# Altium schematic symbol library Analog Devices Data Converters Analog-to-Digital Converters.SchLib: 2404 symbols (part 116 of 213)
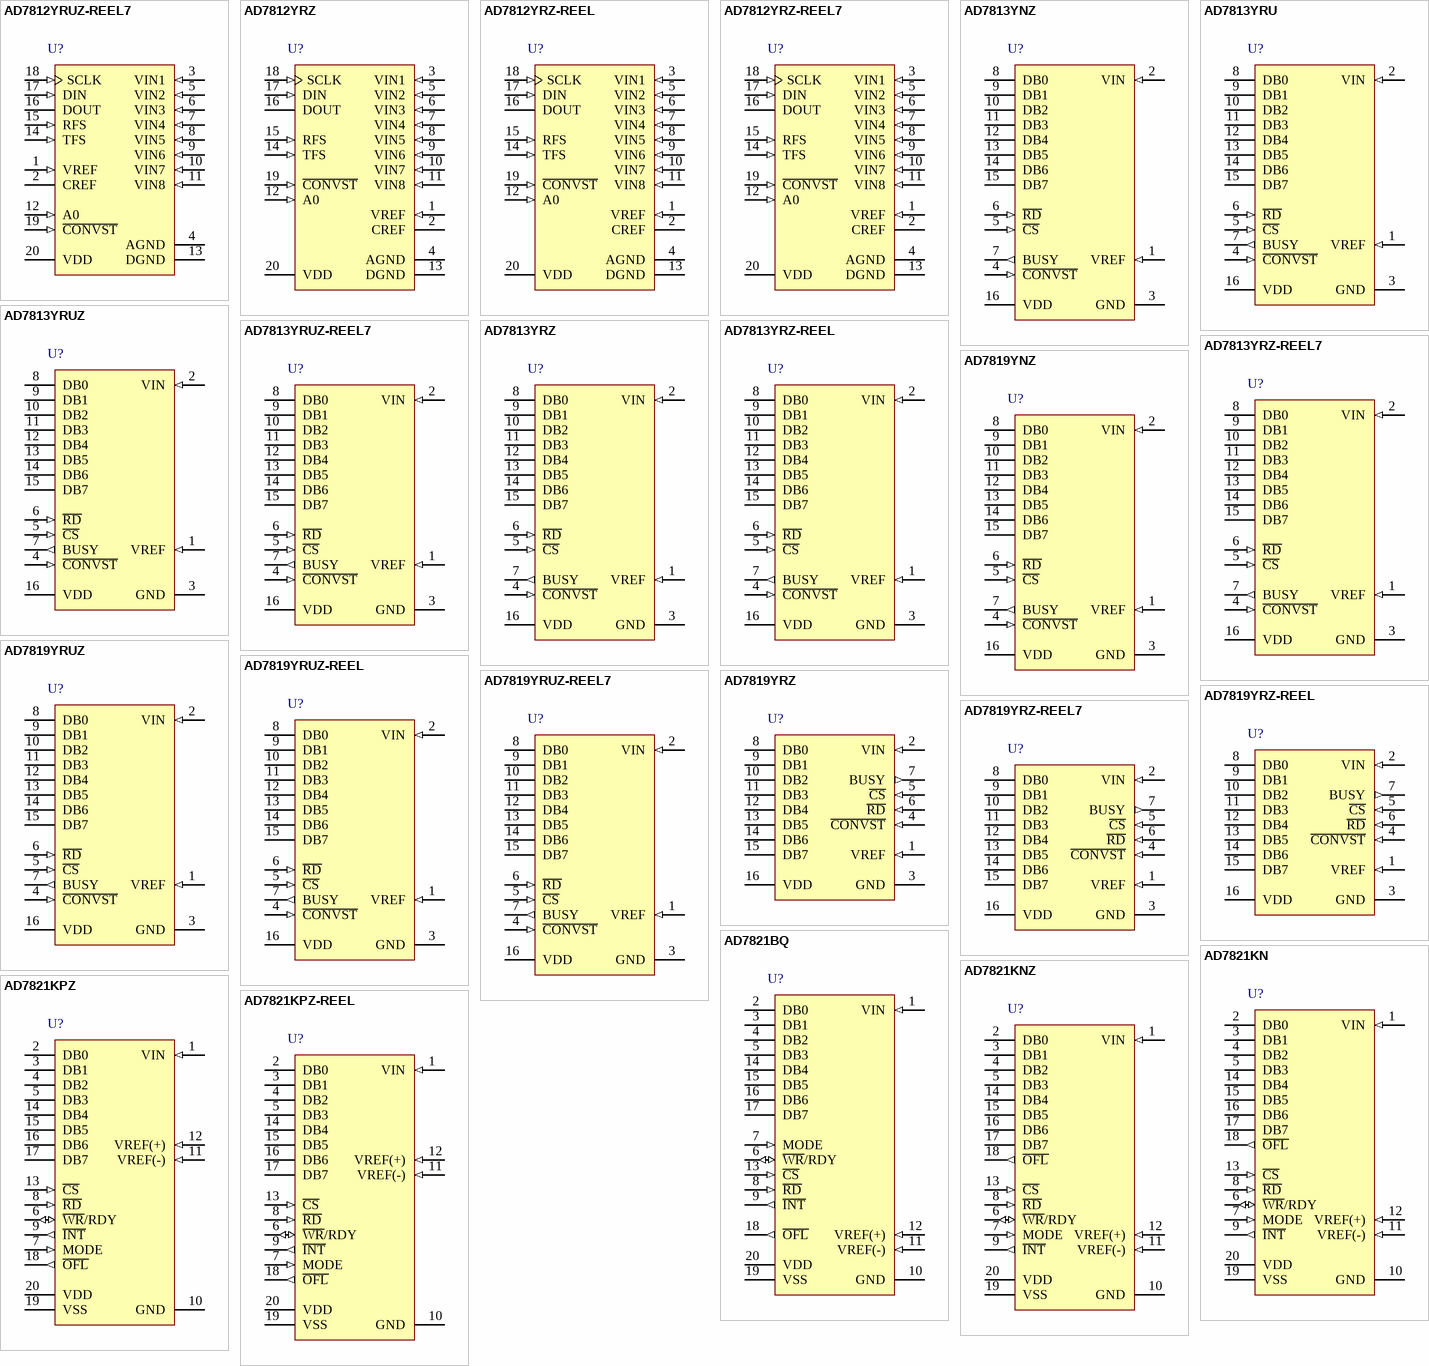
[diagram p271: symbols AD7812YRUZ-REEL7 to AD7821KPZ-REEL]

## AD7821BQ
designator U?
Single 8-Bit uP Compatible Analog-to-Digital Converter with Parallel Interface and Track / Hold, LC2MOS, 1MSPS, -40 to +85 degC, Q-20, Tube; Generic Part Number: AD7821; Manufacturer: Analog Devices; PartNumber: AD7821BQ; Resolution (Bits): 8; Channels: 1; Throughput Rate (SPS): 1M; Interface: Par; DatasheetVersion: Rev.B; PackageVersion: Dec-2004; PackageReference: Q-20; PackageDescription: 20-Lead Ceramic Dual In-Line Package [CERDIP]; Supplier 1: Digi-Key; Supplier Part Number 1: AD7821BQ-ND; Supplier 2: Mouser; Supplier Part Number 2: 584-AD7821BQ; RoHS: N; Packing: Tube; Mounting Technology: Through-hole; ComponentLink1Description: Manufacturer URL; ComponentLink1URL: http://www.analog.com/en/index.html; ComponentLink2Description: Datasheet; ComponentLink2URL: http://www.analog.com/static/imported-files/data_sheets/AD7821.pdf; ComponentLink3Description: Package Specification; ComponentLink3URL: http://www.analog.com/static/imported-files/packages/50516416473314Q_20.pdf; ComponentLink4Description: Product URL; ComponentLink4URL: http://www.analog.com/en/analog-to-digital-converters/ad-converters/ad7821/products/product.html
footprint Q-20 (DIP, 20-Leads, Row Spacing 7.62mm, Pitch 2.54mm, Body 25.9x6.7mm)
pins: 1 VIN (in) "Analog Input: Range VREF(-) =< VIN =< VREF(+)", 2 DB0 (hiz) "Three-State Data Output (LSB)", 3 DB1 (hiz) "Three-State Data Outputs", 4 DB2 (hiz) "Three-State Data Outputs", 5 DB3 (hiz) "Three-State Data Outputs", 6 ~{WR}/RDY (io) "WRITE control input/READY status output. See Digital Interface section.", 7 MODE (in) "Mode Selection Input. It determines whether the device operates in the WR-RD or RD mode. This input is internally pulled low through a 50 uA current source. See Digital Interface section.", 8 ~{RD} (in) "READ Input. R\D\ must be low to access data from the part. See Digital Interface section.", 9 ~{INT} (out) "INTERRUPT Output. I\N\T\ going low indicates that the conversion is complete. I\N\T\ returns high on the rising edge of C\S\ or R\D\. See Digital Interface section.", 10 GND (power) "Ground", 11 VREF(-) (in) "Lower limit of reference span. Range: VSS =< VREF(-) =< VREF(+).", 12 VREF(+) (in) "Upper limit of reference span. Range: VREF(-) < VREF(+) =< VDD.", 13 ~{CS} (in) "Chip Select Input. The device is selected when this input is low.", 14 DB4 (hiz) "Three-State Data Outputs", 15 DB5 (hiz) "Three-State Data Outputs", 16 DB6 (hiz) "Three-State Data Outputs", 17 DB7 (hiz) "Three-State Data Output (MSB)", 18 ~{OFL} (out) "Overflow Output. If the analog input is higher than (VREF(+) - 1/2 LSB), O\F\L\ will be low at the end of conversion. It is a non-three-state output which can be used to cascade two or more devices to increase resolution.", 19 VSS (power) "Negative Supply Voltage VSS = 0 V; Unipolar Operation VSS = -5 V; Bipolar Operation", 20 VDD (power) "Positive Supply Voltage, +5 V"

## AD7821KN
designator U?
Single 8-Bit uP Compatible Analog-to-Digital Converter with Parallel Interface and Track / Hold, LC2MOS, 1MSPS, 0 to +70 degC, N-20, Tube; Generic Part Number: AD7821; Manufacturer: Analog Devices; PartNumber: AD7821KN; Resolution (Bits): 8; Channels: 1; Throughput Rate (SPS): 1M; Interface: Par; DatasheetVersion: Rev.B; PackageVersion: 070706-A; PackageReference: N-20; PackageDescription: 20-Lead Plastic Dual In-Line Package [PDIP] Narrow Body; Supplier 1: Digi-Key; Supplier Part Number 1: AD7821KN-ND; Supplier 2: Mouser; Supplier Part Number 2: 584-AD7821KN; RoHS: N; Packing: Tube; Mounting Technology: Through-hole; Code_JEDEC: MS-001; ComponentLink1Description: Manufacturer URL; ComponentLink1URL: http://www.analog.com/en/index.html; ComponentLink2Description: Datasheet; ComponentLink2URL: http://www.analog.com/static/imported-files/data_sheets/AD7821.pdf; ComponentLink3Description: Package Specification; ComponentLink3URL: http://www.analog.com/static/imported-files/packages/50601349676519N_20.pdf; ComponentLink4Description: Product URL; ComponentLink4URL: http://www.analog.com/en/analog-to-digital-converters/ad-converters/ad7821/products/product.html
footprint N-20 (DIP, 20-Leads, Row Spacing 7.62mm, Pitch 2.54mm, Body 25.9x6.6mm)
pins: 1 VIN (in) "Analog Input: Range VREF(-) =< VIN =< VREF(+)", 2 DB0 (hiz) "Three-State Data Output (LSB)", 3 DB1 (hiz) "Three-State Data Outputs", 4 DB2 (hiz) "Three-State Data Outputs", 5 DB3 (hiz) "Three-State Data Outputs", 6 ~{WR}/RDY (io) "WRITE control input/READY status output. See Digital Interface section.", 7 MODE (in) "Mode Selection Input. It determines whether the device operates in the WR-RD or RD mode. This input is internally pulled low through a 50 μA current source. See Digital Interface section.", 8 ~{RD} (in) "READ Input. R\D\ must be low to access data from the part. See Digital Interface section.", 9 ~{INT} (out) "INTERRUPT Output. I\N\T\ going low indicates that the conversion is complete. I\N\T\ returns high on the rising edge of C\S\ or R\D\. See Digital Interface section.", 10 GND (power) "Ground", 11 VREF(-) (in) "Lower limit of reference span. Range: VSS =< VREF(-) =< VREF(+).", 12 VREF(+) (in) "Upper limit of reference span. Range: VREF(-) < VREF(+) =< VDD.", 13 ~{CS} (in) "Chip Select Input. The device is selected when this input is low.", 14 DB4 (hiz) "Three-State Data Outputs", 15 DB5 (hiz) "Three-State Data Outputs", 16 DB6 (hiz) "Three-State Data Outputs", 17 DB7 (hiz) "Three-State Data Output (MSB)", 18 ~{OFL} (out) "Overflow Output. If the analog input is higher than (VREF(+) - 1/2 LSB), O\F\L\ will be low at the end of conversion. It is a non-three-state output which can be used to cascade two or more devices to increase resolution.", 19 VSS (power) "Negative Supply Voltage VSS = 0 V; Unipolar Operation VSS = -5 V; Bipolar Operation", 20 VDD (power) "Positive Supply Voltage, +5 V"

## AD7821KNZ
designator U?
Single 8-Bit uP Compatible Analog-to-Digital Converter with Parallel Interface and Track / Hold, LC2MOS, 1MSPS, 0 to +70 degC, N-20, Pb-Free, Tube; Generic Part Number: AD7821; Manufacturer: Analog Devices; PartNumber: AD7821KNZ; Resolution (Bits): 8; Channels: 1; Throughput Rate (SPS): 1M; Interface: Par; DatasheetVersion: Rev.B; PackageVersion: 070706-A; PackageReference: N-20; PackageDescription: 20-Lead Plastic Dual In-Line Package [PDIP] Narrow Body; Supplier 1: Digi-Key; Supplier Part Number 1: AD7821KNZ-ND; Supplier 2: Farnell; Supplier Part Number 2: 1438546; Supplier 3: Newark; Supplier Part Number 3: 15P0878; Supplier 4: Newark; Supplier Part Number 4: 59K5576; Supplier 5: Mouser; Supplier Part Number 5: 584-AD7821KNZ; RoHS: Y; Packing: Tube; Mounting Technology: Through-hole; Code_JEDEC: MS-001; ComponentLink1Description: Manufacturer URL; ComponentLink1URL: http://www.analog.com/en/index.html; ComponentLink2Description: Datasheet; ComponentLink2URL: http://www.analog.com/static/imported-files/data_sheets/AD7821.pdf; ComponentLink3Description: Package Specification; ComponentLink3URL: http://www.analog.com/static/imported-files/packages/50601349676519N_20.pdf; ComponentLink4Description: Product URL; ComponentLink4URL: http://www.analog.com/en/analog-to-digital-converters/ad-converters/ad7821/products/product.html
footprint N-20 (DIP, 20-Leads, Row Spacing 7.62mm, Pitch 2.54mm, Body 25.9x6.6mm)
pins: 1 VIN (in) "Analog Input: Range VREF(-) =< VIN =< VREF(+)", 2 DB0 (hiz) "Three-State Data Output (LSB)", 3 DB1 (hiz) "Three-State Data Outputs", 4 DB2 (hiz) "Three-State Data Outputs", 5 DB3 (hiz) "Three-State Data Outputs", 6 ~{WR}/RDY (io) "WRITE control input/READY status output. See Digital Interface section.", 7 MODE (in) "Mode Selection Input. It determines whether the device operates in the WR-RD or RD mode. This input is internally pulled low through a 50 μA current source. See Digital Interface section.", 8 ~{RD} (in) "READ Input. R\D\ must be low to access data from the part. See Digital Interface section.", 9 ~{INT} (out) "INTERRUPT Output. I\N\T\ going low indicates that the conversion is complete. I\N\T\ returns high on the rising edge of C\S\ or R\D\. See Digital Interface section.", 10 GND (power) "Ground", 11 VREF(-) (in) "Lower limit of reference span. Range: VSS =< VREF(-) =< VREF(+).", 12 VREF(+) (in) "Upper limit of reference span. Range: VREF(-) < VREF(+) =< VDD.", 13 ~{CS} (in) "Chip Select Input. The device is selected when this input is low.", 14 DB4 (hiz) "Three-State Data Outputs", 15 DB5 (hiz) "Three-State Data Outputs", 16 DB6 (hiz) "Three-State Data Outputs", 17 DB7 (hiz) "Three-State Data Output (MSB)", 18 ~{OFL} (out) "Overflow Output. If the analog input is higher than (VREF(+) - 1/2 LSB), O\F\L\ will be low at the end of conversion. It is a non-three-state output which can be used to cascade two or more devices to increase resolution.", 19 VSS (power) "Negative Supply Voltage VSS = 0 V; Unipolar Operation VSS = -5 V; Bipolar Operation", 20 VDD (power) "Positive Supply Voltage, +5 V"

## AD7821KPZ
designator U?
Single 8-Bit uP Compatible Analog-to-Digital Converter with Parallel Interface and Track / Hold, LC2MOS, 1MSPS, 0 to +70 degC, P-20A, Pb-Free, Tube; Generic Part Number: AD7821; Manufacturer: Analog Devices; PartNumber: AD7821KPZ; Resolution (Bits): 8; Channels: 1; Throughput Rate (SPS): 1M; Interface: Par; DatasheetVersion: Rev.B; PackageVersion: Nov-2002; PackageReference: P-20A; PackageDescription: 20-Lead Plastic Leaded Chip Carrier [PLCC]; Supplier 1: Digi-Key; Supplier Part Number 1: AD7821KPZ-ND; Supplier 2: Newark; Supplier Part Number 2: 59K5577; Supplier 3: Mouser; Supplier Part Number 3: 584-AD7821KPZ; RoHS: Y; Packing: Tube; Mounting Technology: Surface Mount; Code_JEDEC: MO-047-AA; ComponentLink1Description: Manufacturer URL; ComponentLink1URL: http://www.analog.com/en/index.html; ComponentLink2Description: Datasheet; ComponentLink2URL: http://www.analog.com/static/imported-files/data_sheets/AD7821.pdf; ComponentLink3Description: Package Specification; ComponentLink3URL: http://www.analog.com/static/imported-files/packages/3121431516544404277643669223804694P20A.pdf; ComponentLink4Description: Product URL; ComponentLink4URL: http://www.analog.com/en/analog-to-digital-converters/ad-converters/ad7821/products/product.html
footprint P-20A_N (Leaded Chip Carrier, 20-Leads, Body 9x9mm, Pitch 1.27mm, IPC Medium Density)
footprint P-20A_L (Leaded Chip Carrier, 20-Leads, Body 9x9mm, Pitch 1.27mm, IPC High Density)
footprint P-20A_M (Leaded Chip Carrier, 20-Leads, Body 9x9mm, Pitch 1.27mm, IPC Low Density)
pins: 1 VIN (in) "Analog Input: Range VREF(-) =< VIN =< VREF(+)", 2 DB0 (hiz) "Three-State Data Output (LSB)", 3 DB1 (hiz) "Three-State Data Outputs", 4 DB2 (hiz) "Three-State Data Outputs", 5 DB3 (hiz) "Three-State Data Outputs", 6 ~{WR}/RDY (io) "WRITE control input/READY status output. See Digital Interface section.", 7 MODE (in) "Mode Selection Input. It determines whether the device operates in the WR-RD or RD mode. This input is internally pulled low through a 50 uA current source. See Digital Interface section.", 8 ~{RD} (in) "READ Input. R\D\ must be low to access data from the part. See Digital Interface section.", 9 ~{INT} (out) "INTERRUPT Output. I\N\T\ going low indicates that the conversion is complete. I\N\T\ returns high on the rising edge of C\S\ or R\D\. See Digital Interface section.", 10 GND (power) "Ground", 11 VREF(-) (in) "Lower limit of reference span. Range: VSS =< VREF(-) =< VREF(+).", 12 VREF(+) (in) "Upper limit of reference span. Range: VREF(-) < VREF(+) =< VDD.", 13 ~{CS} (in) "Chip Select Input. The device is selected when this input is low.", 14 DB4 (hiz) "Three-State Data Outputs", 15 DB5 (hiz) "Three-State Data Outputs", 16 DB6 (hiz) "Three-State Data Outputs", 17 DB7 (hiz) "Three-State Data Output (MSB)", 18 ~{OFL} (out) "Overflow Output. If the analog input is higher than (VREF(+) - 1/2 LSB), O\F\L\ will be low at the end of conversion. It is a non-three-state output which can be used to cascade two or more devices to increase resolution.", 19 VSS (power) "Negative Supply Voltage VSS = 0 V; Unipolar Operation VSS = -5 V; Bipolar Operation", 20 VDD (power) "Positive Supply Voltage, +5 V"

## AD7821KPZ-REEL
designator U?
Single 8-Bit uP Compatible Analog-to-Digital Converter with Parallel Interface and Track / Hold, LC2MOS, 1MSPS, 0 to +70 degC, P-20A, Pb-Free, Reel; Generic Part Number: AD7821; Manufacturer: Analog Devices; PartNumber: AD7821KPZ-REEL; Resolution (Bits): 8; Channels: 1; Throughput Rate (SPS): 1M; Interface: Par; DatasheetVersion: Rev.B; PackageVersion: Nov-2002; PackageReference: P-20A; PackageDescription: 20-Lead Plastic Leaded Chip Carrier [PLCC]; Supplier 1: Digi-Key; Supplier Part Number 1: AD7821KPZ-REEL-ND; Supplier 2: Mouser; Supplier Part Number 2: 584-AD7821KPZ-R; RoHS: Y; Packing: Reel; Mounting Technology: Surface Mount; Code_JEDEC: MO-047-AA; ComponentLink1Description: Manufacturer URL; ComponentLink1URL: http://www.analog.com/en/index.html; ComponentLink2Description: Datasheet; ComponentLink2URL: http://www.analog.com/static/imported-files/data_sheets/AD7821.pdf; ComponentLink3Description: Package Specification; ComponentLink3URL: http://www.analog.com/static/imported-files/packages/3121431516544404277643669223804694P20A.pdf; ComponentLink4Description: Product URL; ComponentLink4URL: http://www.analog.com/en/analog-to-digital-converters/ad-converters/ad7821/products/product.html
footprint P-20A_N (Leaded Chip Carrier, 20-Leads, Body 9x9mm, Pitch 1.27mm, IPC Medium Density)
footprint P-20A_L (Leaded Chip Carrier, 20-Leads, Body 9x9mm, Pitch 1.27mm, IPC High Density)
footprint P-20A_M (Leaded Chip Carrier, 20-Leads, Body 9x9mm, Pitch 1.27mm, IPC Low Density)
pins: 1 VIN (in) "Analog Input: Range VREF(-) =< VIN =< VREF(+)", 2 DB0 (hiz) "Three-State Data Output (LSB)", 3 DB1 (hiz) "Three-State Data Outputs", 4 DB2 (hiz) "Three-State Data Outputs", 5 DB3 (hiz) "Three-State Data Outputs", 6 ~{WR}/RDY (io) "WRITE control input/READY status output. See Digital Interface section.", 7 MODE (in) "Mode Selection Input. It determines whether the device operates in the WR-RD or RD mode. This input is internally pulled low through a 50 uA current source. See Digital Interface section.", 8 ~{RD} (in) "READ Input. R\D\ must be low to access data from the part. See Digital Interface section.", 9 ~{INT} (out) "INTERRUPT Output. I\N\T\ going low indicates that the conversion is complete. I\N\T\ returns high on the rising edge of C\S\ or R\D\. See Digital Interface section.", 10 GND (power) "Ground", 11 VREF(-) (in) "Lower limit of reference span. Range: VSS =< VREF(-) =< VREF(+).", 12 VREF(+) (in) "Upper limit of reference span. Range: VREF(-) < VREF(+) =< VDD.", 13 ~{CS} (in) "Chip Select Input. The device is selected when this input is low.", 14 DB4 (hiz) "Three-State Data Outputs", 15 DB5 (hiz) "Three-State Data Outputs", 16 DB6 (hiz) "Three-State Data Outputs", 17 DB7 (hiz) "Three-State Data Output (MSB)", 18 ~{OFL} (out) "Overflow Output. If the analog input is higher than (VREF(+) - 1/2 LSB), O\F\L\ will be low at the end of conversion. It is a non-three-state output which can be used to cascade two or more devices to increase resolution.", 19 VSS (power) "Negative Supply Voltage VSS = 0 V; Unipolar Operation VSS = -5 V; Bipolar Operation", 20 VDD (power) "Positive Supply Voltage, +5 V"

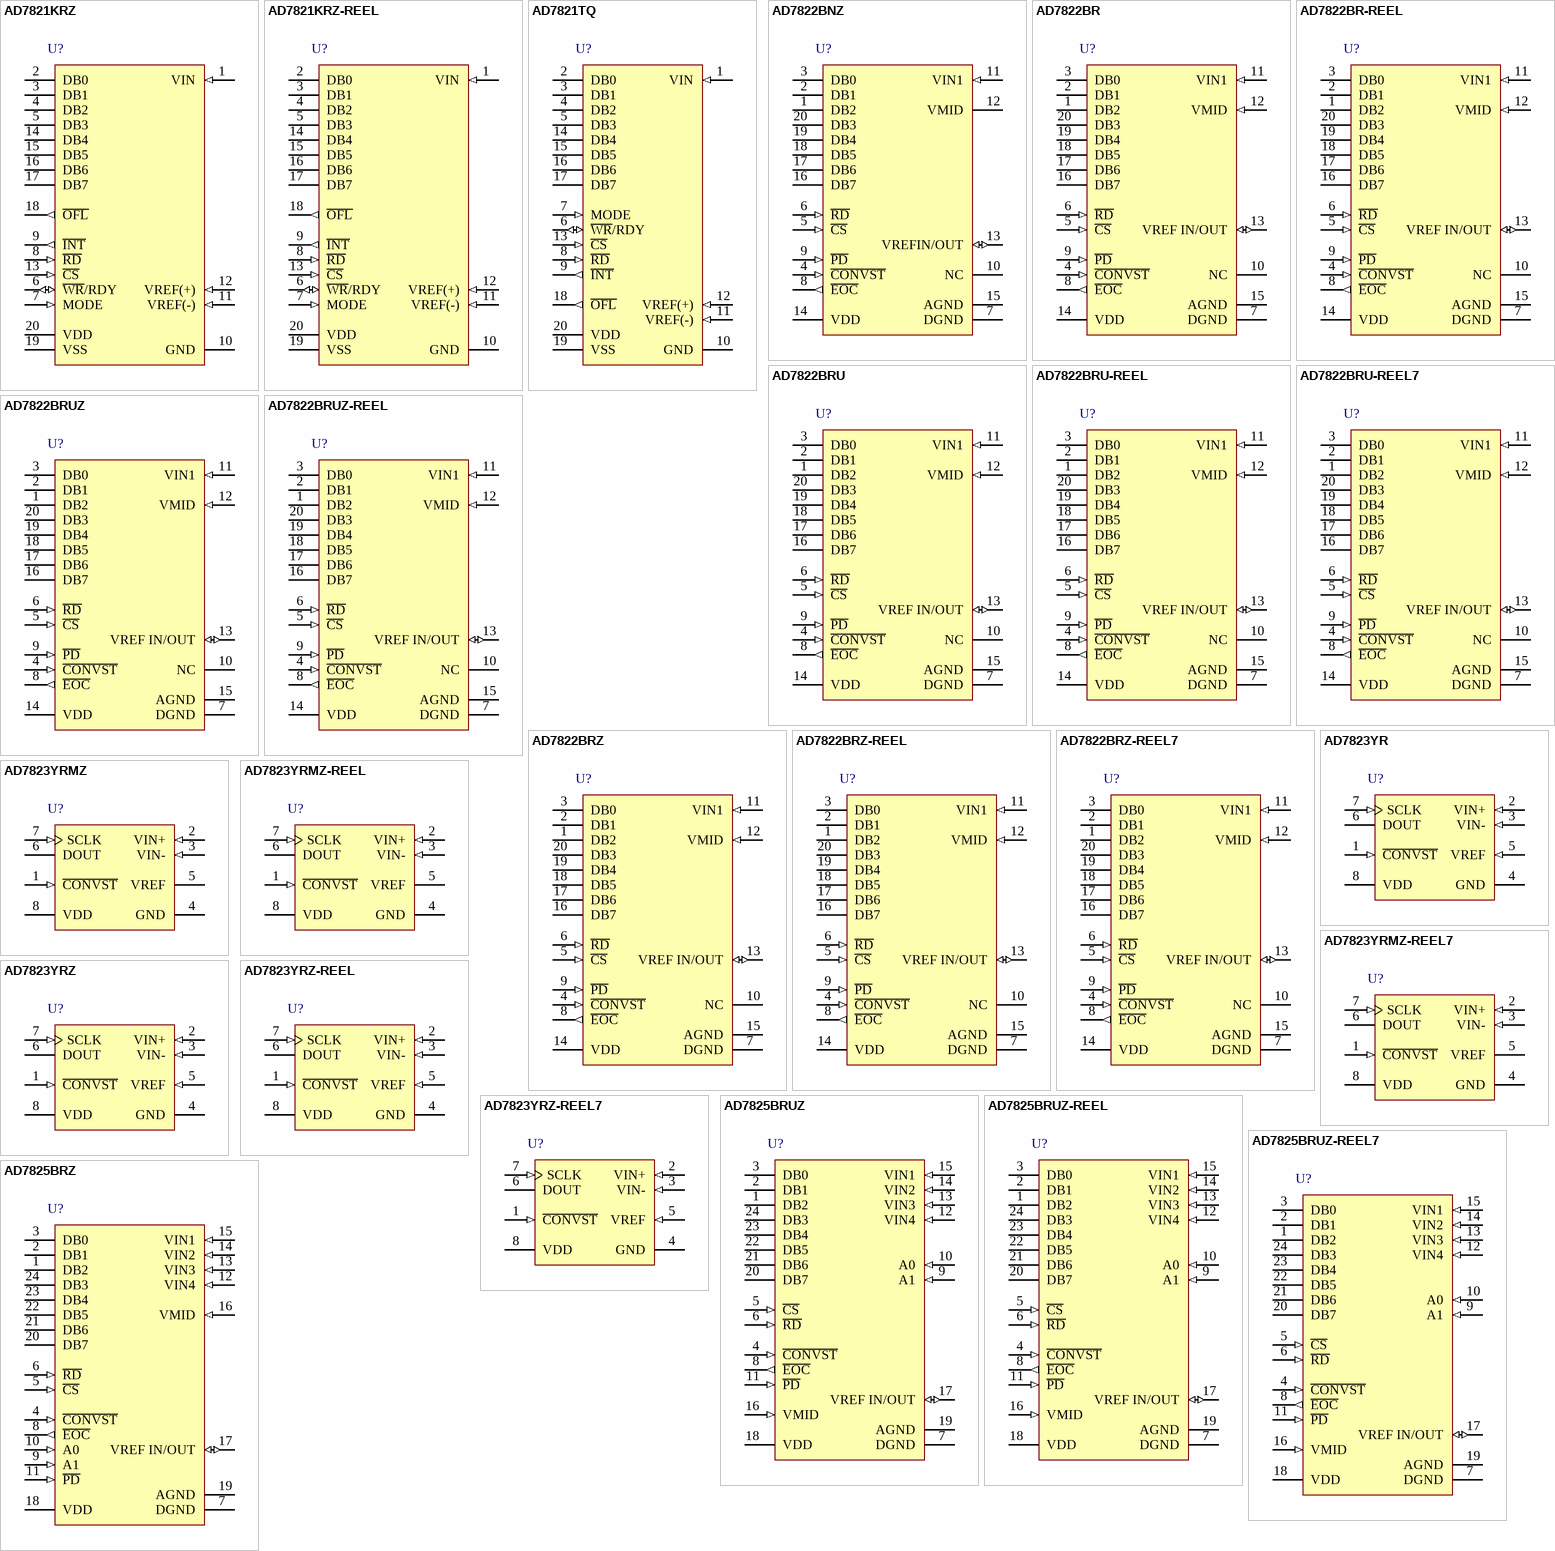
[diagram p65: symbols AD7821KRZ to AD7825BRZ]

## AD7821KRZ
designator U?
Single 8-Bit uP Compatible Analog-to-Digital Converter with Parallel Interface and Track / Hold, LC2MOS, 1MSPS, 0 to +70 degC, RW-20, Pb-Free, Tube; Generic Part Number: AD7821; Manufacturer: Analog Devices; PartNumber: AD7821KRZ; Resolution (Bits): 8; Channels: 1; Throughput Rate (SPS): 1M; Interface: Par; DatasheetVersion: Rev.B; PackageVersion: 060706-A; PackageReference: RW-20; PackageDescription: 20-Lead Standard Small Outline Package [SOIC_W] Wide Body; Supplier 1: Digi-Key; Supplier Part Number 1: AD7821KRZ-ND; Supplier 2: Farnell; Supplier Part Number 2: 2127825; Supplier 3: Newark; Supplier Part Number 3: 88H0035; Supplier 4: Mouser; Supplier Part Number 4: 584-AD7821KRZ; RoHS: Y; Packing: Tube; Mounting Technology: Surface Mount; Code_JEDEC: MS-013-AC; ComponentLink1Description: Manufacturer URL; ComponentLink1URL: http://www.analog.com/en/index.html; ComponentLink2Description: Datasheet; ComponentLink2URL: http://www.analog.com/static/imported-files/data_sheets/AD7821.pdf; ComponentLink3Description: Package Specification; ComponentLink3URL: http://www.analog.com/static/imported-files/packages/233848RW_20.pdf; ComponentLink4Description: Product URL; ComponentLink4URL: http://www.analog.com/en/analog-to-digital-converters/ad-converters/ad7821/products/product.html
footprint RW-20_N (SOIC, 20-Leads, Body 12.8x7.5mm, Pitch 1.27mm, IPC Medium Density)
footprint RW-20_L (SOIC, 20-Leads, Body 12.8x7.5mm, Pitch 1.27mm, IPC High Density)
footprint RW-20_M (SOIC, 20-Leads, Body 12.8x7.5mm, Pitch 1.27mm, IPC Low Density)
pins: 1 VIN (in) "Analog Input: Range VREF(-) =< VIN =< VREF(+)", 2 DB0 (hiz) "Three-State Data Output (LSB)", 3 DB1 (hiz) "Three-State Data Outputs", 4 DB2 (hiz) "Three-State Data Outputs", 5 DB3 (hiz) "Three-State Data Outputs", 6 ~{WR}/RDY (io) "WRITE control input/READY status output. See Digital Interface section.", 7 MODE (in) "Mode Selection Input. It determines whether the device operates in the WR-RD or RD mode. This input is internally pulled low through a 50 uA current source. See Digital Interface section.", 8 ~{RD} (in) "READ Input. R\D\ must be low to access data from the part. See Digital Interface section.", 9 ~{INT} (out) "INTERRUPT Output. I\N\T\ going low indicates that the conversion is complete. I\N\T\ returns high on the rising edge of C\S\ or R\D\. See Digital Interface section.", 10 GND (power) "Ground", 11 VREF(-) (in) "Lower limit of reference span. Range: VSS =< VREF(-) =< VREF(+).", 12 VREF(+) (in) "Upper limit of reference span. Range: VREF(-) < VREF(+) =< VDD.", 13 ~{CS} (in) "Chip Select Input. The device is selected when this input is low.", 14 DB4 (hiz) "Three-State Data Outputs", 15 DB5 (hiz) "Three-State Data Outputs", 16 DB6 (hiz) "Three-State Data Outputs", 17 DB7 (hiz) "Three-State Data Output (MSB)", 18 ~{OFL} (out) "Overflow Output. If the analog input is higher than (VREF(+) - 1/2 LSB), O\F\L\ will be low at the end of conversion. It is a non-three-state output which can be used to cascade two or more devices to increase resolution.", 19 VSS (power) "Negative Supply Voltage VSS = 0 V; Unipolar Operation VSS = -5 V; Bipolar Operation", 20 VDD (power) "Positive Supply Voltage, +5 V"

## AD7821KRZ-REEL
designator U?
Single 8-Bit uP Compatible Analog-to-Digital Converter with Parallel Interface and Track / Hold, LC2MOS, 1MSPS, 0 to +70 degC, RW-20, Pb-Free, Reel; Generic Part Number: AD7821; Manufacturer: Analog Devices; PartNumber: AD7821KRZ-REEL; Resolution (Bits): 8; Channels: 1; Throughput Rate (SPS): 1M; Interface: Par; DatasheetVersion: Rev.B; PackageVersion: 060706-A; PackageReference: RW-20; PackageDescription: 20-Lead Standard Small Outline Package [SOIC_W] Wide Body; Supplier 1: Digi-Key; Supplier Part Number 1: AD7821KRZ-REELTR-ND; Supplier 2: Digi-Key; Supplier Part Number 2: AD7821KRZ-REELCT-ND; Supplier 3: Digi-Key; Supplier Part Number 3: AD7821KRZ-REELDKR-ND; Supplier 4: Newark; Supplier Part Number 4: 88H0036; Supplier 5: Mouser; Supplier Part Number 5: 584-AD7821KRZ-R; RoHS: Y; Packing: Reel; Mounting Technology: Surface Mount; Code_JEDEC: MS-013-AC; ComponentLink1Description: Manufacturer URL; ComponentLink1URL: http://www.analog.com/en/index.html; ComponentLink2Description: Datasheet; ComponentLink2URL: http://www.analog.com/static/imported-files/data_sheets/AD7821.pdf; ComponentLink3Description: Package Specification; ComponentLink3URL: http://www.analog.com/static/imported-files/packages/233848RW_20.pdf; ComponentLink4Description: Product URL; ComponentLink4URL: http://www.analog.com/en/analog-to-digital-converters/ad-converters/ad7821/products/product.html
footprint RW-20_N (SOIC, 20-Leads, Body 12.8x7.5mm, Pitch 1.27mm, IPC Medium Density)
footprint RW-20_L (SOIC, 20-Leads, Body 12.8x7.5mm, Pitch 1.27mm, IPC High Density)
footprint RW-20_M (SOIC, 20-Leads, Body 12.8x7.5mm, Pitch 1.27mm, IPC Low Density)
pins: 1 VIN (in) "Analog Input: Range VREF(-) =< VIN =< VREF(+)", 2 DB0 (hiz) "Three-State Data Output (LSB)", 3 DB1 (hiz) "Three-State Data Outputs", 4 DB2 (hiz) "Three-State Data Outputs", 5 DB3 (hiz) "Three-State Data Outputs", 6 ~{WR}/RDY (io) "WRITE control input/READY status output. See Digital Interface section.", 7 MODE (in) "Mode Selection Input. It determines whether the device operates in the WR-RD or RD mode. This input is internally pulled low through a 50 uA current source. See Digital Interface section.", 8 ~{RD} (in) "READ Input. R\D\ must be low to access data from the part. See Digital Interface section.", 9 ~{INT} (out) "INTERRUPT Output. I\N\T\ going low indicates that the conversion is complete. I\N\T\ returns high on the rising edge of C\S\ or R\D\. See Digital Interface section.", 10 GND (power) "Ground", 11 VREF(-) (in) "Lower limit of reference span. Range: VSS =< VREF(-) =< VREF(+).", 12 VREF(+) (in) "Upper limit of reference span. Range: VREF(-) < VREF(+) =< VDD.", 13 ~{CS} (in) "Chip Select Input. The device is selected when this input is low.", 14 DB4 (hiz) "Three-State Data Outputs", 15 DB5 (hiz) "Three-State Data Outputs", 16 DB6 (hiz) "Three-State Data Outputs", 17 DB7 (hiz) "Three-State Data Output (MSB)", 18 ~{OFL} (out) "Overflow Output. If the analog input is higher than (VREF(+) - 1/2 LSB), O\F\L\ will be low at the end of conversion. It is a non-three-state output which can be used to cascade two or more devices to increase resolution.", 19 VSS (power) "Negative Supply Voltage VSS = 0 V; Unipolar Operation VSS = -5 V; Bipolar Operation", 20 VDD (power) "Positive Supply Voltage, +5 V"

## AD7821TQ
designator U?
Single 8-Bit uP Compatible Analog-to-Digital Converter with Parallel Interface and Track / Hold, LC2MOS, 1MSPS, -55 to +125 degC, Q-20, Tube; Generic Part Number: AD7821; Manufacturer: Analog Devices; PartNumber: AD7821TQ; Resolution (Bits): 8; Channels: 1; Throughput Rate (SPS): 1M; Interface: Par; DatasheetVersion: Rev.B; PackageVersion: Dec-2004; PackageReference: Q-20; PackageDescription: 20-Lead Ceramic Dual In-Line Package [CERDIP]; Supplier 1: Digi-Key; Supplier Part Number 1: AD7821TQ-ND; Supplier 2: Mouser; Supplier Part Number 2: 584-AD7821TQ; RoHS: N; Packing: Tube; Mounting Technology: Through-hole; ComponentLink1Description: Manufacturer URL; ComponentLink1URL: http://www.analog.com/en/index.html; ComponentLink2Description: Datasheet; ComponentLink2URL: http://www.analog.com/static/imported-files/data_sheets/AD7821.pdf; ComponentLink3Description: Package Specification; ComponentLink3URL: http://www.analog.com/static/imported-files/packages/50516416473314Q_20.pdf; ComponentLink4Description: Product URL; ComponentLink4URL: http://www.analog.com/en/analog-to-digital-converters/ad-converters/ad7821/products/product.html
footprint Q-20 (DIP, 20-Leads, Row Spacing 7.62mm, Pitch 2.54mm, Body 25.9x6.7mm)
pins: 1 VIN (in) "Analog Input: Range VREF(-) =< VIN =< VREF(+)", 2 DB0 (hiz) "Three-State Data Output (LSB)", 3 DB1 (hiz) "Three-State Data Outputs", 4 DB2 (hiz) "Three-State Data Outputs", 5 DB3 (hiz) "Three-State Data Outputs", 6 ~{WR}/RDY (io) "WRITE control input/READY status output. See Digital Interface section.", 7 MODE (in) "Mode Selection Input. It determines whether the device operates in the WR-RD or RD mode. This input is internally pulled low through a 50 uA current source. See Digital Interface section.", 8 ~{RD} (in) "READ Input. R\D\ must be low to access data from the part. See Digital Interface section.", 9 ~{INT} (out) "INTERRUPT Output. I\N\T\ going low indicates that the conversion is complete. I\N\T\ returns high on the rising edge of C\S\ or R\D\. See Digital Interface section.", 10 GND (power) "Ground", 11 VREF(-) (in) "Lower limit of reference span. Range: VSS =< VREF(-) =< VREF(+).", 12 VREF(+) (in) "Upper limit of reference span. Range: VREF(-) < VREF(+) =< VDD.", 13 ~{CS} (in) "Chip Select Input. The device is selected when this input is low.", 14 DB4 (hiz) "Three-State Data Outputs", 15 DB5 (hiz) "Three-State Data Outputs", 16 DB6 (hiz) "Three-State Data Outputs", 17 DB7 (hiz) "Three-State Data Output (MSB)", 18 ~{OFL} (out) "Overflow Output. If the analog input is higher than (VREF(+) - 1/2 LSB), O\F\L\ will be low at the end of conversion. It is a non-three-state output which can be used to cascade two or more devices to increase resolution.", 19 VSS (power) "Negative Supply Voltage VSS = 0 V; Unipolar Operation VSS = -5 V; Bipolar Operation", 20 VDD (power) "Positive Supply Voltage, +5 V"
